# Altium schematic symbol library 13-Analog D 数模模数.SchLib: 573 symbols (part 5 of 6) (continued)
## SKHI 21A R (continued)

## SKHI 61 R
designator IC?
Sixpack IGBT and MOSFET Driver
pins: 1 BS (in), 2 BOT3 (out), 3 TOP3 (out), 4 BOT2 (out), 5 TOP2 (out), 6 BOT1 (out), 7 TOP1 (out), 8 ~{ERR} (out), 9 BSS (power), 10 BSS (power), 11 +15V (power), 12 +15V (power), 13 TDT1 (in), 14 TDT2 (in), 15 SEL (in), 16 BSTD (in), 17 ~{ERRIN} (in), 18 NC, 19 BRK (in), 20 ~{BEER} (out), AS-1 RGATE (out), AS-2 VCET1 (out), AS-3 E (out), AS-4 VCET2 (out), AS-9 VCE (out), B1-1 RGATE (out), B1-2 VCET1 (out), B1-3 E (out), B1-4 VCET2 (out), B1-9 VCE (out), B2-1 RGATE (out), B2-2 VCET1 (out), B2-3 E (out), B2-4 VCET2 (out), B2-9 VCE (out), B3-1 RGATE (out), B3-2 VCET1 (out), B3-3 E (out), B3-4 VCET2 (out), B3-9 VCE (out), T1-1 RGATE (in), T1-2 VCET1 (out), T1-3 E (in), T1-4 VCET2 (out), T1-9 VCE (in), T2-1 RGATE (out), T2-2 VCET1 (out), T2-3 E (out), T2-4 VCET2 (out), T2-9 VCE (out), T3-1 RGATE (out), T3-2 VCET1 (out), T3-3 E (out), T3-4 VCET2 (out), T3-9 VCE (out)
text: Switch; Additional

## SKY12343-364LF
designator IC?
0.01 - 4.0 GHz Seven-Bit Digital Attenuator with Serial and Parallel Drivers
pins: 1 N/C, 2 VDD, 3 P/S, 4 A0, 5 N/C, 6 N/C, 7 RF1, 8 N/C, 9 N/C, 10 N/C, 11 N/C, 12 N/C, 13 N/C, 14 N/C, 15 N/C, 16 N/C, 17 N/C, 18 RF2, 19 N/C, 20 N/C, 21 A2, 22 A1, 23 LE, 24 CLK, 25 DATA, 26 V1, 27 V2, 28 V3, 29 V4, 30 V5, 31 V6, 32 V7, 33 GND (power)

## SN65HVD20
designator IC?
Extended Common-Mode RS-485 Transceiver
pins: 1 R (out), 2 ~{RE} (in), 3 DE (in), 4 D (in), 5 GND (power), 6 A (io), 7 B (io), 8 VCC (power)

## SN65HVD3088E
designator IC?
Low-Power RS-485 Transceiver
pins: 1 R (out), 2 ~{RE} (in), 3 DE (in), 4 D (in), 5 GND (power), 6 A (io), 7 B (io), 8 VCC (power)

## SN65LVDM051
designator IC?
High-Speed Differential Line Drivers And Receivers
pins: 1 1B (in), 2 1A (in), 3 1R (out), 4 1DE (in), 5 2R (out), 6 2A (in), 7 2B (in), 8 GND (power), 9 2D (in), 10 2Y (out), 11 2Z (out), 12 2DE (in), 13 1Z (out), 14 1Y (out), 15 1D (in), 16 VCC (power)

## SN65LVDM176
designator IC?
Half-Duplex LVDM Transceiver
pins: 1 R (out), 2 ~{RE} (in), 3 DE (in), 4 D (in), 5 GND (power), 6 A (io), 7 B (io), 8 VCC (power)

## SN65LVDS1DBV
designator IC?
High-Speed Differential Line Driver
pins: 1 VCC (power), 2 GND (power), 3 A (out), 4 B (out), 5 R (in)

## SN65LVDS2DBV
designator IC?
High-Speed Differential Line Receiver
pins: 1 VCC (power), 2 GND (power), 3 A (in), 4 B (in), 5 R (out)

## SN65LVDS34
designator IC?
Dual LVDS High-Speed Differential Receiver
pins: 1 VCC (power), 2 1Y (out), 3 2Y (out), 4 GND (power), 5 2B (in), 6 2A (in), 7 1B (in), 8 1A (in)

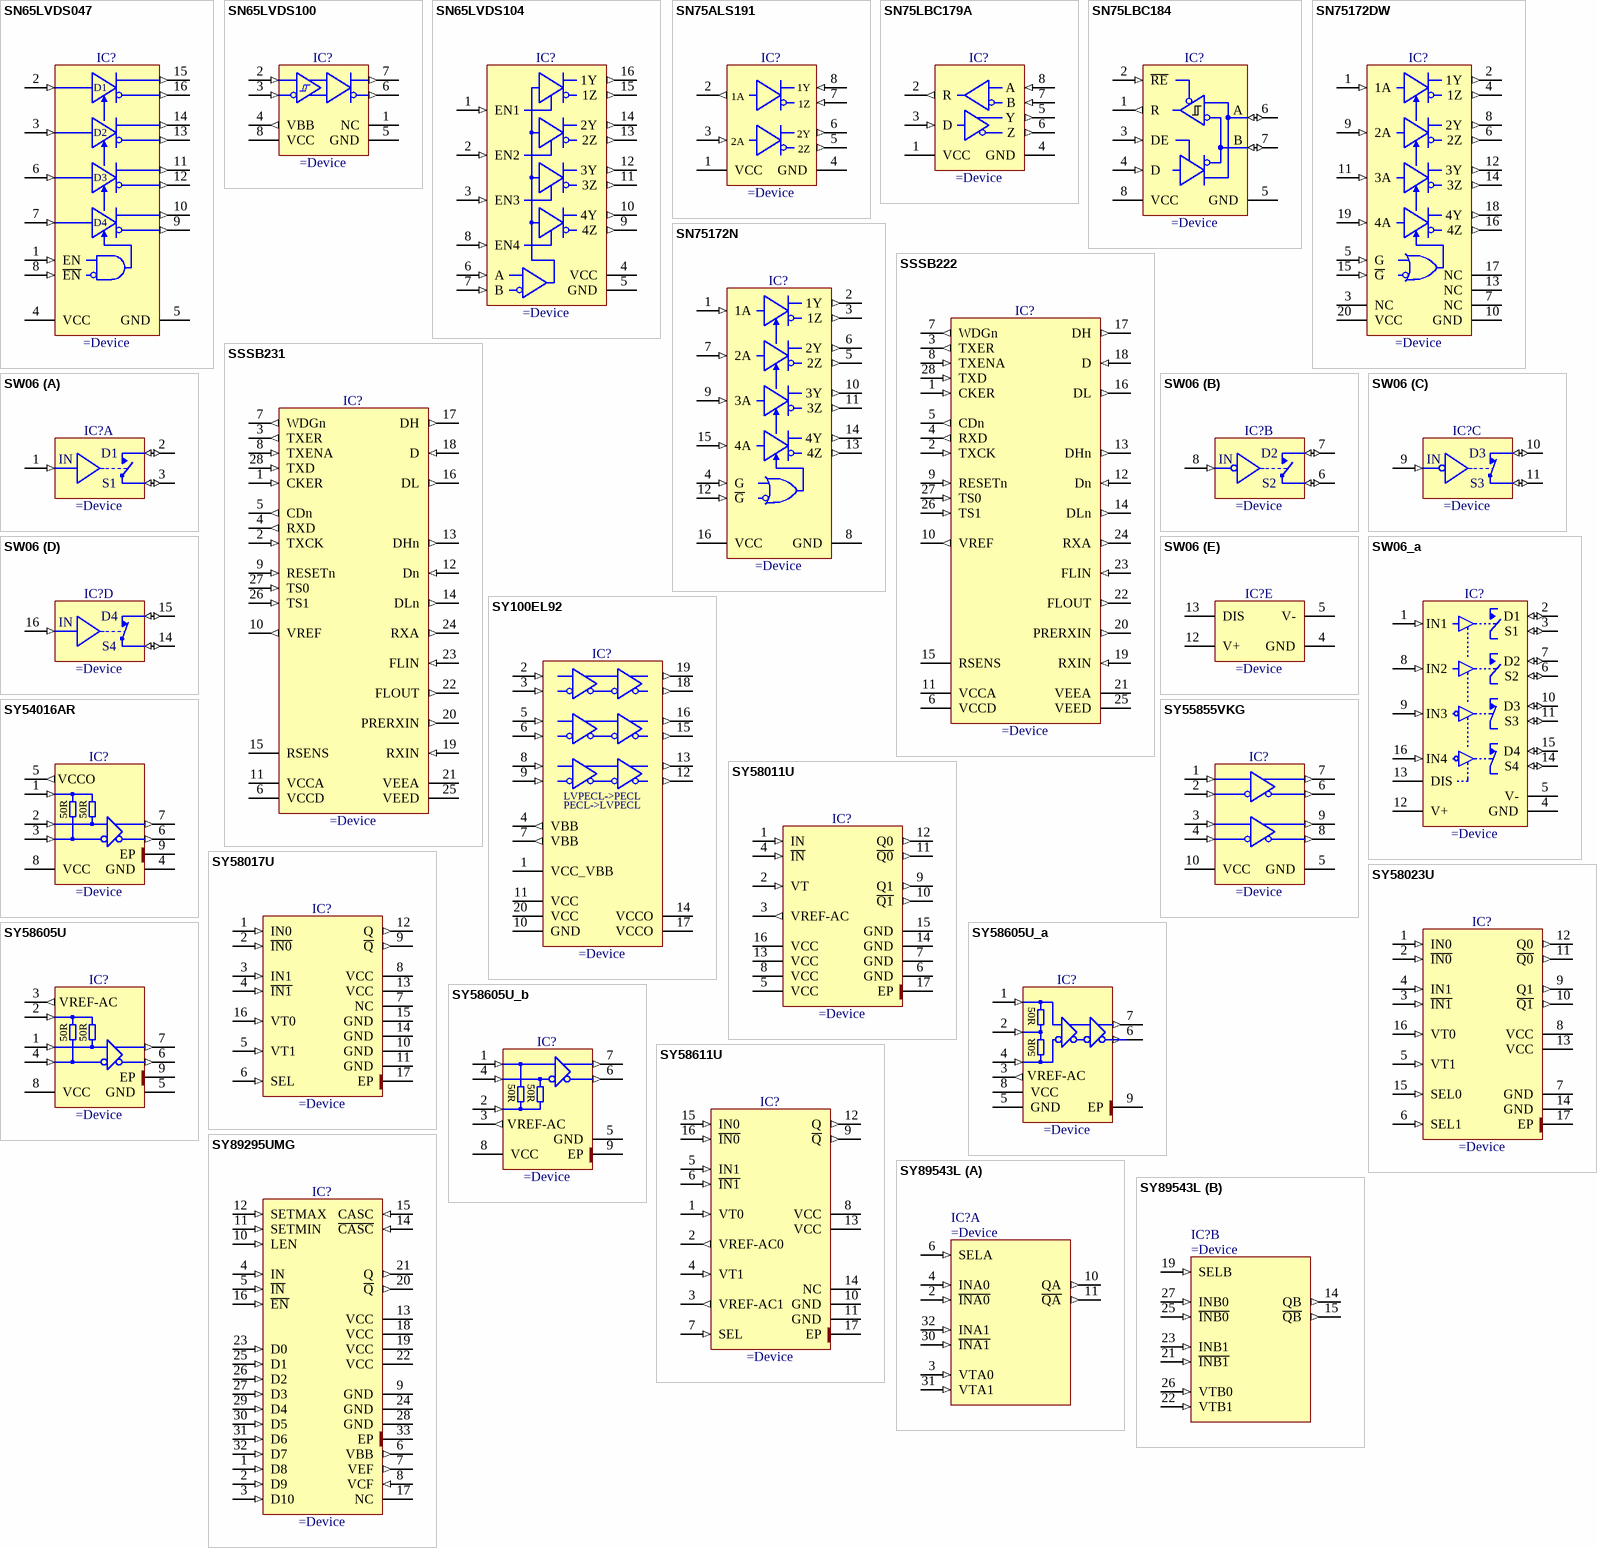
[diagram p34: symbols SN65LVDS047 to SY89543L]

## SN65LVDS047
designator IC?
LVDS Quad Differential Line Driver
pins: 1 EN (in), 2 DIN1 (in), 3 DIN2 (in), 4 VCC (power), 5 GND (power), 6 DIN3 (in), 7 DIN4 (in), 8 ~{EN} (in), 9 DOUT4- (out), 10 DOUT4+ (out), 11 DOUT3+ (out), 12 DOUT3- (out), 13 DOUT2- (out), 14 DOUT2+ (out), 15 DOUT1+ (out), 16 DOUT1- (out)
text: D1; D2; D3; D4

## SN65LVDS100
designator IC?
Differential LVDS Translator/Repeater
pins: 1 NC, 2 A (in), 3 B (in), 4 VBB (out), 5 GND (power), 6 Z (out), 7 Y (out), 8 VCC (power)

## SN65LVDS104
designator IC?
4-Port LVDS repeater
pins: 1 EN1 (in), 2 EN2 (in), 3 EN3 (in), 4 VCC (power), 5 GND (power), 6 A (in), 7 B (in), 8 EN4 (in), 9 4Z (out), 10 4Y (out), 11 3Z (out), 12 3Y (out), 13 2Z (out), 14 2Y (out), 15 1Z (out), 16 1Y (out)

## SN75ALS191
designator IC?
Dual Differential Line Driver
pins: 1 VCC (power), 2 1A (out), 3 2A (in), 4 GND (power), 5 2Z (out), 6 2Y (out), 7 1Z (in), 8 1Y (in)

## SN75LBC179A
designator IC?
RS-485 Low-Power Differential Line Driver And Receiver Pairs
pins: 1 VCC (power), 2 R (out), 3 D (in), 4 GND (power), 5 Y (out), 6 Z (out), 7 B (in), 8 A (in)

## SN75LBC184
designator IC?
Differential Transceiver with Transient Voltage Suppression
pins: 1 R (out), 2 ~{RE} (in), 3 DE (in), 4 D (in), 5 GND (power), 6 A (io), 7 B (io), 8 VCC (power)

## SN75172DW
designator IC?
Quadruple Differential Line Driver
pins: 1 1A (in), 2 1Y (out), 3 NC, 4 1Z (out), 5 G (in), 6 2Z (out), 7 NC, 8 2Y (out), 9 2A (in), 10 GND (power), 11 3A (in), 12 3Y (out), 13 NC, 14 3Z (out), 15 ~{G} (in), 16 4Z (out), 17 NC, 18 4Y (out), 19 4A (in), 20 VCC (power)

## SN75172N
designator IC?
Quadruple Differential Line Driver
pins: 1 1A (in), 2 1Y (out), 3 1Z (out), 4 G (in), 5 2Z (out), 6 2Y (out), 7 2A (in), 8 GND (power), 9 3A (in), 10 3Y (out), 11 3Z (out), 12 ~{G} (in), 13 4Z (out), 14 4Y (out), 15 4A (in), 16 VCC (power)

## SSSB222
designator IC?
FIELDDRIVE line driver
pins: 1 CKER (in) "Transmit error detect clock", 2 TXCK (in) "Half bit clock", 3 TXER (out) "Transmit data error", 4 RXD (out) "Received data", 5 CDn (out) "Carrier detect", 6 VCCD (power) "Digital positive supply +5V", 7 WDGn (out) "Transmitter watchdog", 8 TXENA (in) "Transmit data enable", 9 RESETn (in) "Initialization control", 10 VREF (out) "Voltage reference", 11 VCCA (power) "Analog positive supply +5V", 12 Dn (in) "Differential data line", 13 DHn (out) "Differential transmitter data", 14 DLn (out) "Differential transmitter data", 15 RSENS (power) "Driver supply", 16 DL (out) "Differential transmitter data", 17 DH (out) "Differential transmitter data", 18 D (in) "Differential data line", 19 RXIN (in) "Analog comparators", 20 PRERXIN (out) "Received, filtered an adapted data", 21 VEEA (power) "Analog ground", 22 FLOUT (out) "Active filter output", 23 FLIN (in) "Active filter input", 24 RXA (out) "Differential amplifier output", 25 VEED (power) "Digital ground", 26 TS1 (in) "TTL Input", 27 TS0 (in) "Test", 28 TXD (in) "Transmit data"

## SSSB231
designator IC?
FIELDDRIVE line driver
pins: 1 CKER (in) "Transmit error detect clock", 2 TXCK (in) "Half bit clock", 3 TXER (out) "Transmit data error", 4 RXD (out) "Received data", 5 CDn (out) "Carrier detect", 6 VCCD (power) "Digital positive supply +5V", 7 WDGn (out) "Transmitter watchdog", 8 TXENA (in) "Transmit data enable", 9 RESETn (in) "Initialization control", 10 VREF (out) "Voltage reference", 11 VCCA (power) "Analog positive supply +5V", 12 Dn (in) "Differential data line", 13 DHn (out) "Differential transmitter data", 14 DLn (out) "Differential transmitter data", 15 RSENS (power) "Driver supply", 16 DL (out) "Differential transmitter data", 17 DH (out) "Differential transmitter data", 18 D (in) "Differential data line", 19 RXIN (in) "Analog comparators", 20 PRERXIN (out) "Received, filtered an adapted data", 21 VEEA (power) "Analog ground", 22 FLOUT (out) "Active filter output", 23 FLIN (in) "Active filter input", 24 RXA (out) "Differential amplifier output", 25 VEED (power) "Digital ground", 26 TS1 (in) "TTL Input", 27 TS0 (in) "Test", 28 TXD (in) "Transmit data"

## SW06
designator IC?
Quad SPST JFET Analog Switch
part A pins: 1 IN (in), 2 D (io), 3 S (io)
part B pins: 6 S (io), 7 D (io), 8 IN (in)
part C pins: 9 IN (in), 10 D (io), 11 S (io)
part D pins: 14 S (io), 15 D (io), 16 IN (in)
part E pins: 4 GND (power), 5 V- (power), 12 V+ (power), 13 DIS (power)
part A text: D1; S1
part B text: D2; S2
part C text: D3; S3
part D text: D4; S4

## SW06_a
designator IC?
Quad SPST JFET Analog Switch
pins: 1 IN1 (in), 2 D1 (io), 3 S1 (io), 4 GND (power), 5 V- (power), 6 S2 (io), 7 D2 (io), 8 IN2 (in), 9 IN3 (in), 10 D3 (io), 11 S3 (io), 12 V+ (power), 13 DIS (power), 14 S4 (io), 15 D4 (io), 16 IN4 (in)

## SY100EL92
designator IC?
Triple LVPECL-to-PECL or PECL-to-LVPECL Translator
pins: 1 VCC_VBB (power), 2 D0 (in), 3 ~{D0} (in), 4 VBB (out), 5 D1 (in), 6 ~{D1} (in), 7 VBB (out), 8 D2 (in), 9 ~{D2} (in), 10 GND (power), 11 VCC (power), 12 ~{Q2} (out), 13 Q2 (out), 14 VCCO (power), 15 ~{Q1} (out), 16 Q1 (out), 17 VCCO (power), 18 ~{Q0} (out), 19 Q0 (out), 20 VCC (power)
text: LVPECL->PECL; PECL->LVPECL

## SY54016AR
designator IC?
Low Voltage 1.2V/1.8V CML Differential Line Driver/Receiver 3.2Gbps, 3.2GHz
pins: 1 VT (in), 2 IN (in), 3 ~{IN} (in), 4 GND (power), 5 VCCO (out), 6 ~{Q} (out), 7 Q (out), 8 VCC (power), 9 EP (power)
text: 50R

## SY55855VKG
designator IC?
Dual CML/PECL/LVPECL-to-LVDS Translator
pins: 1 D0 (in), 2 ~{D0} (in), 3 D1 (in), 4 ~{D1} (in), 5 GND (power), 6 ~{Q1} (out), 7 Q1 (out), 8 ~{Q0} (out), 9 Q0 (out), 10 VCC (power)

## SY58011U
designator IC?
7GHz 1:2 CML Fanout Buffer/Translator w/400mv CML Outputs and Internal Input Termination
pins: 1 IN (in), 2 VT (in), 3 VREF-AC (out), 4 ~{IN} (in), 5 VCC (power), 6 GND (power), 7 GND (power), 8 VCC (power), 9 Q1 (out), 10 ~{Q1} (out), 11 ~{Q0} (out), 12 Q0 (out), 13 VCC (power), 14 GND (power), 15 GND (power), 16 VCC (power), 17 EP (power)

## SY58017U
designator IC?
10.7Gbps Differential CML 2:1 MUX with Internal Termination
pins: 1 IN0 (in), 2 ~{IN0} (in), 3 IN1 (in), 4 ~{IN1} (in), 5 VT1 (in), 6 SEL (in), 7 NC, 8 VCC (power), 9 ~{Q} (out), 10 GND (power), 11 GND (power), 12 Q (out), 13 VCC (power), 14 GND (power), 15 GND (power), 16 VT0 (in), 17 EP (power)

## SY58023U
designator IC?
10.7Gbps 2 x 2 Crosspoint Switch w/CML Outputs and Internal Termination
pins: 1 IN0 (in), 2 ~{IN0} (in), 3 ~{IN1} (in), 4 IN1 (in), 5 VT1 (in), 6 SEL1 (in), 7 GND (power), 8 VCC (power), 9 Q1 (out), 10 ~{Q1} (out), 11 ~{Q0} (out), 12 Q0 (out), 13 VCC (power), 14 GND (power), 15 SEL0 (in), 16 VT0 (in), 17 EP (power)

## SY58605U
designator IC?
3.2Gbps Precision, LVDS Buffer with Internal Termination and Fail Safe Input
pins: 1 IN (in), 2 VT (in), 3 VREF-AC (out), 4 ~{IN} (in), 5 GND (power), 6 ~{Q} (out), 7 Q (out), 8 VCC (power), 9 EP (power)
text: 50R

## SY58605U_a
designator IC?
3.2Gbps Precision, LVDS Buffer with Internal Termination and Fail Safe Input
pins: 1 IN (in), 2 VT (in), 3 VREF-AC (out), 4 ~{IN} (in), 5 GND (power), 6 ~{Q} (out), 7 Q (out), 8 VCC (power), 9 EP (power)
text: 50R

## SY58605U_b
designator IC?
3.2Gbps Precision, LVDS Buffer with Internal Termination and Fail Safe Input
pins: 1 IN (in), 2 VT (in), 3 VREF-AC (out), 4 ~{IN} (in), 5 GND (power), 6 ~{Q} (out), 7 Q (out), 8 VCC (power), 9 EP (power)
text: 50R

## SY58611U
designator IC?
3.2Gbps Precision, 2:1 LVDS MUX With Internal Termination And Fail Safe Input
pins: 1 VT0 (in), 2 VREF-AC0 (out), 3 VREF-AC1 (out), 4 VT1 (in), 5 IN1 (in), 6 ~{IN1} (in), 7 SEL (in), 8 VCC (power), 9 ~{Q} (out), 10 GND (power), 11 GND (power), 12 Q (out), 13 VCC (power), 14 NC, 15 IN0 (in), 16 ~{IN0} (in), 17 EP (power)

## SY89295UMG
designator IC?
2.5V/3.3V 1.5GHz Precision LVPECL Programmable Delay
pins: 1 D8 (in), 2 D9 (in), 3 D10 (in), 4 IN (in), 5 ~{IN} (in), 6 VBB (out), 7 VEF (out), 8 VCF (in), 9 GND (power), 10 LEN (in), 11 SETMIN (in), 12 SETMAX (in), 13 VCC (power), 14 ~{CASC} (in), 15 CASC (in), 16 ~{EN} (in), 17 NC, 18 VCC (power), 19 VCC (power), 20 ~{Q} (out), 21 Q (out), 22 VCC (power), 23 D0 (in), 24 GND (power), 25 D1 (in), 26 D2 (in), 27 D3 (in), 28 GND (power), 29 D4 (in), 30 D5 (in), 31 D6 (in), 32 D7 (in), 33 EP (power)

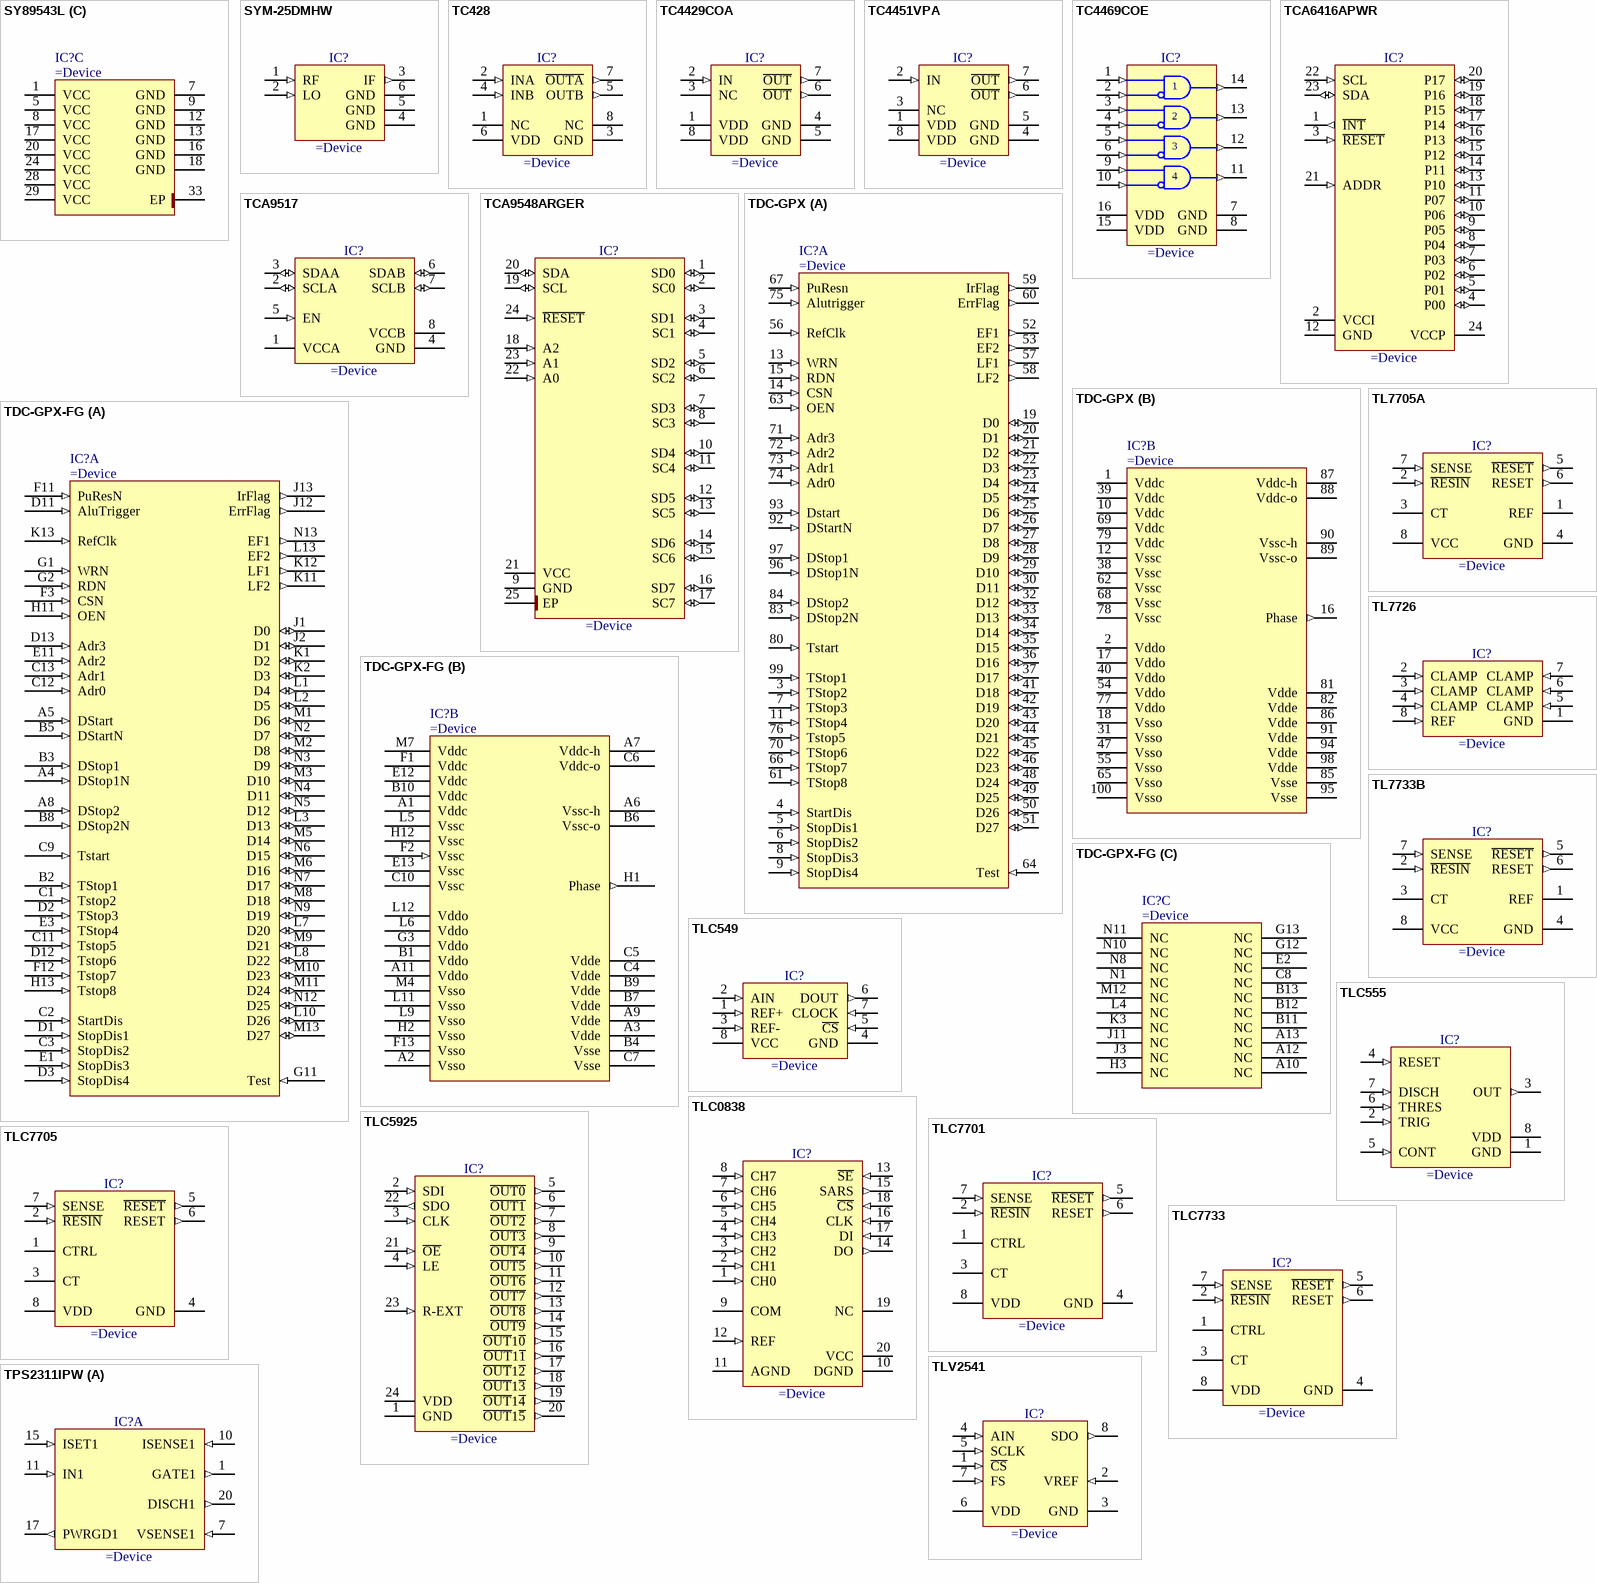
[diagram p35: symbols SY89543L to TPS2311IPW]

## SY89543L
designator IC?
3.3V, 3.2Gbps Dual, Differential 2:1 LVDS Multiplexer With Internal Termination
part A pins: 2 ~{INA0} (in), 3 VTA0 (in), 4 INA0 (in), 6 SELA (in), 10 QA (out), 11 ~{QA} (out), 30 ~{INA1} (in), 31 VTA1 (in), 32 INA1 (in)
part B pins: 14 QB (out), 15 ~{QB} (out), 19 SELB (in), 21 ~{INB1} (in), 22 VTB1 (in), 23 INB1 (in), 25 ~{INB0} (in), 26 VTB0 (in), 27 INB0 (in)
part C pins: 1 VCC (power), 5 VCC (power), 7 GND (power), 8 VCC (power), 9 GND (power), 12 GND (power), 13 GND (power), 16 GND (power), 17 VCC (power), 18 GND (power), 20 VCC (power), 24 VCC (power), 28 VCC (power), 29 VCC (power), 33 EP (power)

## SYM-25DMHW
designator IC?
Frequency Mixer - Level 13 (LO Power +13 dBm) 40 to 2500 MHz
pins: 1 RF (in), 2 LO (in), 3 IF (out), 4 GND (power), 5 GND (power), 6 GND (power)

## TC428
designator IC?
1.5A Dual High-Speed Power MOSFET Driver
pins: 1 NC, 2 INA (in), 3 GND (power), 4 INB (in), 5 OUTB (out), 6 VDD (power), 7 ~{OUTA} (out), 8 NC

## TC4429COA
designator IC?
6A High-Speed MOSFET Driver
pins: 1 VDD (power), 2 IN (in), 3 NC, 4 GND (power), 5 GND (power), 6 ~{OUT} (out), 7 ~{OUT} (out), 8 VDD (power)

## TC4451VPA
designator IC?
12A High-Speed MOSFET Drivers
pins: 1 VDD (power), 2 IN (in), 3 NC, 4 GND (power), 5 GND (power), 6 ~{OUT} (out), 7 ~{OUT} (out), 8 VDD (power)